# Altium footprint library uc_connectors.PcbLib: 237 footprints (part 15 of 15)
Each footprint in its own frame and in the unit in brackets; x right, y up, seen from the top. Pads: shape width x height; smd on the part's side, far side on the other; paste and mask are expansions set on the pad; w line width, h text height; cw(c..) or ccw(c..) is an arc to the next point about the centre after c.
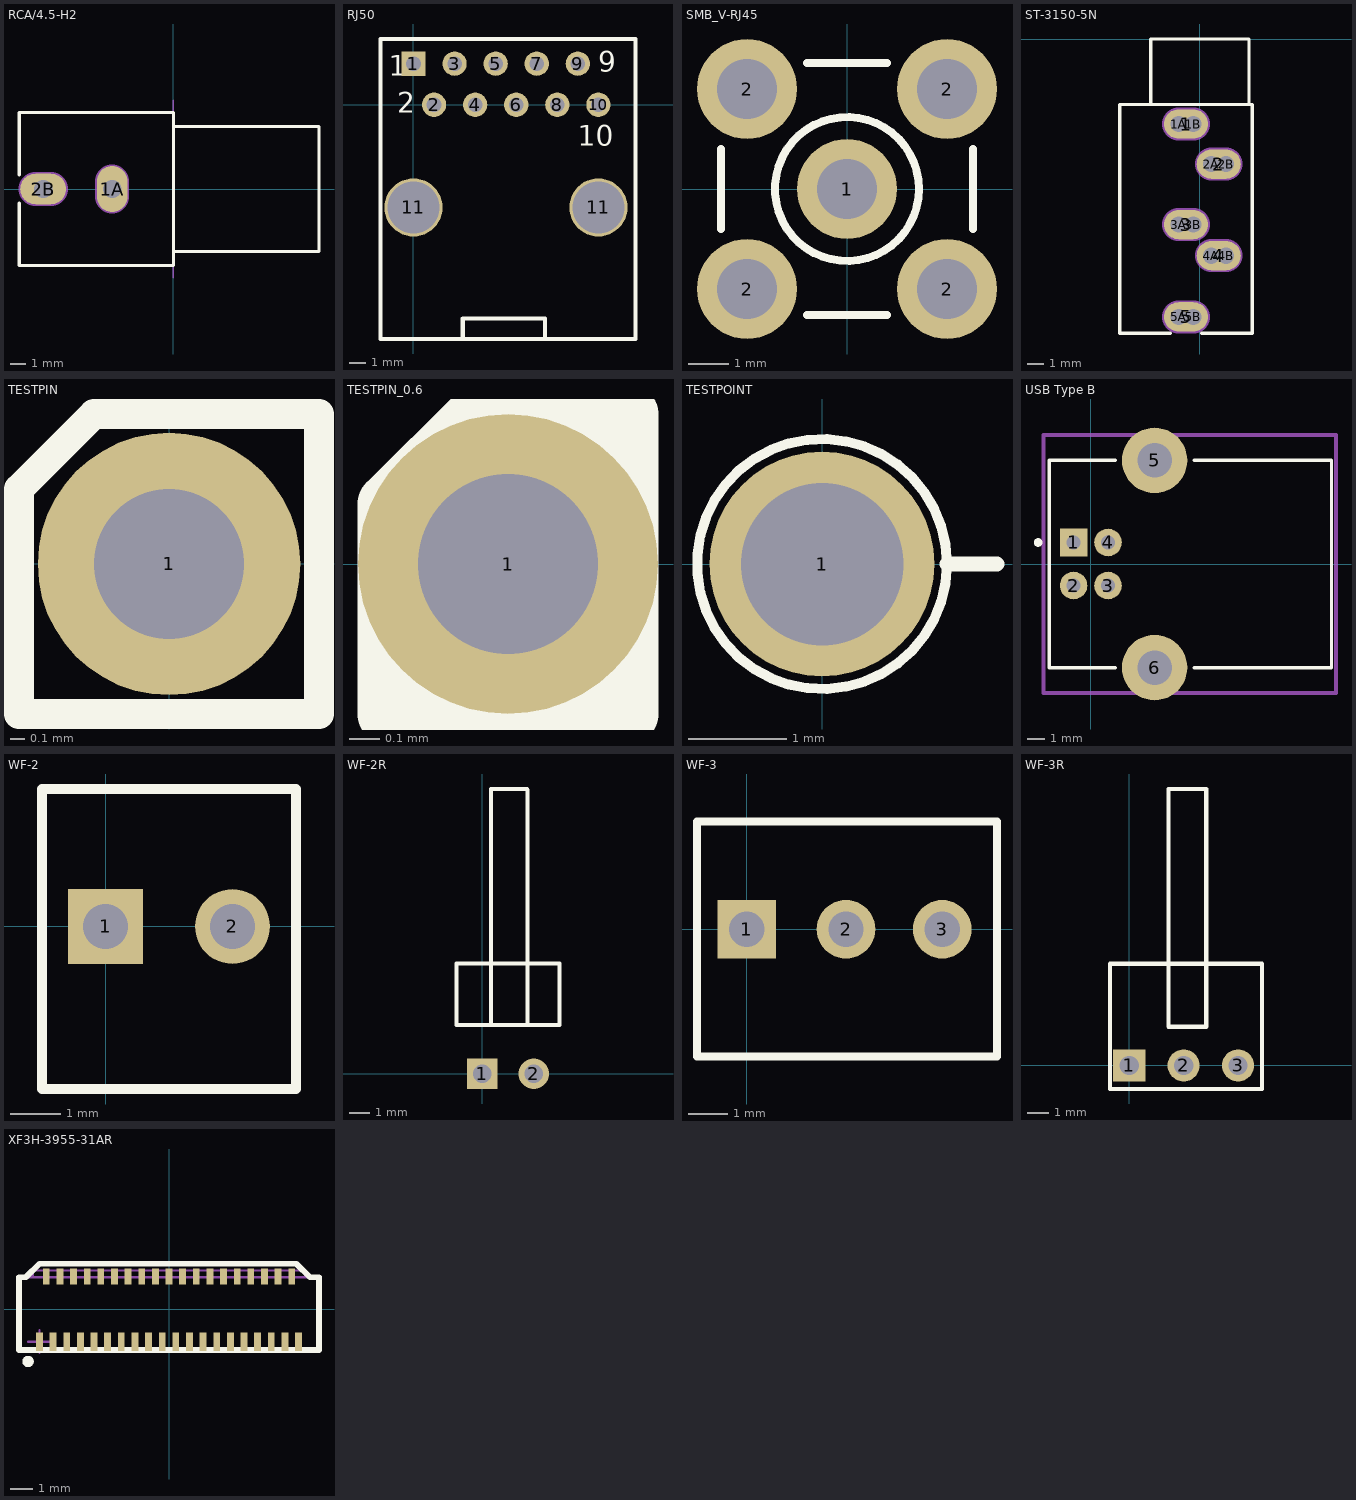
[diagram p14: the footprints below, top view; thin cyan lines are the x and y axes]

## RCA/4.5-H2 [mm] "Two Conductor Jack (RCA), Right Angle, Thru-Hole, Body 10 x 10 x 13 mm (WxTxH)"
height 13
pads (2):
  oval 2x3 hole 1.2: 1A(-4,0)
  oval 3x2 hole 1.2: 2B(-8.496,0)
Top Overlay:
  lines w0.2: -10.075,5 -0.018,5 ; -10.057,-0.92 -10.057,-5 0,-5 0,5 ; -10.057,0.92 -10.057,5 ; 0,-4.065 9.5,-4.065 9.5,4.065 0,4.065
Mechanical 1:
  lines w0.1: 0,-5.8 0,5.8
  lines w1.2: -8.996,0 -7.996,0 ; -4,-0.5 -4,0.5
  text "PCB Edge" at -0.333,-4.618 h0.25
  text "Alert PCB fab to slot details" at -10.057,7.842 h0.3
  text "Slot 1.2x2.2mm, PTH" at -10.057,7.342 h0.3
  text "Assign keep-out area to slot" at -10.057,8.342 h0.3
  text "Mech 1 - Slot cut-out" at -10.057,6.842 h0.3
  text "Mech 2 - Clearance, move to internal plane if present" at -10.057,6.342 h0.3
Mechanical 2:
  lines w2.216: -8.996,0 -7.996,0 ; -4,-0.5 -4,0.5

## RJ50 [mm] "Connector; Header; 5x2 Position"
pads (12):
  rect 1.5x1.5 hole 0.9: 1(0,2.54)
  round 1.5 hole 0.9: 2(1.27,0) 3(2.54,2.54) 4(3.81,0) 5(5.08,2.54) 6(6.35,0) 7(7.62,2.54) 8(8.89,0) 9(10.16,2.54) 10(11.43,0)
  round 3.6 hole 3.2: 11(0,-6.35) 11(11.43,-6.35)
Top Overlay:
  lines w0.254: 3.048,-14.456 3.048,-13.208 8.128,-13.208 8.128,-14.456 ; -2.032,-14.478 -2.032,4.064 13.716,4.064 13.716,-14.478 -2.032,-14.478
  text "2" at -1.016,-0.508 h1.27
  text "1" at -1.524,1.778 h1.27
  text "9" at 11.43,2.032 h1.27
  text "10" at 10.16,-2.54 h1.27
3D body "User Library-ConecConvTelefonico10viasAcodado76365101RRojo.step": height 12.5, standoff -3.6, extent -1.778,-14.334 13.488,3.666

## SMB_V-RJ45 [mm] "Connector; SMB Straight"
pads (5):
  round 2.5 hole 1.5: 1(0,0) 2(-2.5,-2.5) 2(-2.5,2.5) 2(2.5,-2.5) 2(2.5,2.5)
Top Overlay:
  circle w0.2: c0,0 r1.8
  lines w0.2: -3.15,-1 -3.15,1 ; -1,-3.15 1,-3.15 ; -1,3.15 1,3.15 ; 3.15,-1 3.15,1
Mechanical 1:
  circle w0.025: c0,0 r1.8
  circle w0.025: c0,0 r1.05
  circle w0.025: c0,0 r0.2

## ST-3150-5N [mm] "Connector; Stereo Jack, 3.5mm, 5 Position"
pads (15):
  oval 2.7x1.8 all layers, no hole: 1(-0.85,-5.2) 2(1.15,-7.65) 3(-0.85,-11.35) 4(1.15,-13.25) 5(-0.85,-17)
  round 1.2 hole 1: 1A(-1.3,-5.2) 1B(-0.4,-5.2) 2A(0.7,-7.65) 2B(1.6,-7.65) 3A(-1.3,-11.35) 3B(-0.4,-11.35) 4A(0.7,-13.25) 4B(1.6,-13.25) 5A(-1.3,-17) 5B(-0.4,-17)
Top Overlay:
  lines w0.2: -3,-4 -3,0 3,0 3,-4 ; -1.8,-18 -4.9,-18 -4.9,-4 3.2,-4 3.2,-18 0.1,-18
Mechanical 1:
  lines w1: -1.3,-17 -0.4,-17 ; -1.3,-11.35 -0.4,-11.35 ; -1.3,-5.2 -0.4,-5.2 ; 0.7,-13.25 1.6,-13.25 ; 0.7,-7.65 1.6,-7.65
  text "Mech 2 - Clearance, move to internal plane if present" at -7.226,0.374 h0.3
  text "Mech 1 - Slot cut-out" at -7.226,0.874 h0.3
  text "Assign keep-out area to slot" at -7.226,2.374 h0.3
  text "Slot 1x1.9mm, PTH" at -7.226,1.374 h0.3
  text "Alert PCB fab to slot details" at -7.226,1.874 h0.3
Mechanical 2:
  lines w2.016: -1.3,-17 -0.4,-17 ; -1.3,-11.35 -0.4,-11.35 ; -1.3,-5.2 -0.4,-5.2 ; 0.7,-13.25 1.6,-13.25 ; 0.7,-7.65 1.6,-7.65

## TESTPIN [mil]
pads (1):
  round 70 hole 40: 1(0,0)
Top Overlay:
  lines w8: -40,-40 40,-40 40,40 -20,40 -40,20 -40,-40
3D body: height 470, standoff -120, extent -15,-15 15,15
3D body: height 40, standoff 0, extent -40,-40 40,40

## TESTPIN_0.6 [mm]
pads (1):
  round 1 hole 0.6: 1(0,0)
Top Overlay:
  lines w0.203: -0.4,-0.5 -0.4,0.2 -0.1,0.5 0.4,0.5 0.4,-0.5 -0.4,-0.5

## TESTPOINT [mil]
pads (1):
  round 90 hole 65: 1(0,0)
Top Overlay:
  circle w4: c0,0 r50
  lines w6: 50,0 70,0
3D body: height 125, standoff 5, extent -52,-51.79 51.59,52
3D body: height 150, standoff -100, extent -19.84,-20 20,19.92
3D body: height 253.89, standoff 146.11, extent -53.79,-23.5 53.79,21.5

## USB Type B [mm] "Connector; USB1.1, Type B, Thru-Hole; 4 Position; Right Angle"
height 11.1
pads (6):
  rect 1.6x1.6 hole 0.8: 1(-1,1.25)
  round 1.6 hole 0.8: 2(-1,-1.25) 3(1,-1.25) 4(1,1.25)
  round 3.8 hole 2: 5(3.71,6.02) 6(3.71,-6.02)
Top Overlay:
  circle w0.25: c-3.06,1.25 r0.125
  lines w0.2: 1.41,-6.02 -2.41,-6.02 -2.41,6.02 1.41,6.02 ; 6.01,-6.02 13.99,-6.02 13.99,6.02 6.01,6.02
Mechanical 15:
  lines w0.254: -2.75,-7.5 -2.75,7.5 14.25,7.5 14.25,-7.5 -2.75,-7.5
3D body "User Library-Samtec - USB-B-S-X-W-TH.STEP": height 11, standoff -3.64, extent -2.55,-7.4 13.95,7.398

## WF-2 [mm] "Connector; Header; 2 Position"
pads (2):
  rect 1.5x1.5 hole 0.9: 1(0,0)
  round 1.5 hole 0.9: 2(2.54,0)
Top Overlay:
  lines w0.2: -1.27,-3.25 -1.27,2.75 3.81,2.75 3.81,-3.25 -1.27,-3.25
3D body "User Library-WF-2.STEP": height 11.73, standoff -2.55, extent -1.35,-3.25 3.85,2.65

## WF-2R [mm] "Connector; Header; 2 Position"
pads (2):
  rect 1.5x1.5 hole 0.9: 1(0,0)
  round 1.5 hole 0.9: 2(2.54,0)
Top Overlay:
  lines w0.2: -1.27,5.4 -1.27,2.4 3.81,2.4 3.81,5.4 ; -1.27,5.45 3.81,5.45 ; 0.43,2.5 0.43,14 ; 0.43,14.05 2.2,14.05 ; 2.23,2.4 2.23,14
3D body "User Library-WF-2R.step": height 5.8, standoff -3.4, extent -1.18,-0.3 3.9,12.9

## WF-3 [mm] "Connector; Header 2.54; 3 Position"
pads (3):
  rect 1.5x1.5 hole 0.9: 1(0,0)
  round 1.5 hole 0.9: 2(2.54,0) 3(5,0)
Top Overlay:
  lines w0.2: -1.27,-3.25 6.4,-3.25 6.4,2.75 -1.27,2.75 -1.27,-3.25
3D body "User Library-WF-3.step": height 11.73, standoff -3, extent -1.36,-3.2 6.44,2.7

## WF-3R [mm] "Connector; Header; 3 Position"
pads (3):
  rect 1.5x1.5 hole 0.9: 1(0,0)
  round 1.5 hole 0.9: 2(2.54,0) 3(5.08,0)
Top Overlay:
  lines w0.2: -0.9,-1.1 6.2,-1.1 6.2,4.75 -0.9,4.75 -0.9,-1.1 ; 1.83,1.8 3.6,1.8 3.6,12.9 1.83,12.9 1.83,1.8
3D body "User Library-WF-2R.step": height 5.8, standoff -3.4, extent 0.12,-0.3 5.2,12.9

## XF3H-3955-31AR [mm] "Connector; FPC/FFC, SM, 50 Position, Right Angle, Pitch 0.3mm"
height 2
pads (39):
  rect 0.3x0.8 smd: 1(-5.7,-1.432) 3(-5.1,-1.432) 5(-4.5,-1.432) 7(-3.9,-1.432) 9(-3.3,-1.432) 11(-2.7,-1.432) 13(-2.1,-1.432) 15(-1.5,-1.432) 17(-0.9,-1.432) 19(-0.3,-1.432) 21(0.3,-1.432) 23(0.9,-1.432) 25(1.5,-1.432) 27(2.1,-1.432) 29(2.7,-1.432) 31(3.3,-1.432) 33(3.9,-1.432) 35(4.5,-1.432) 37(5.1,-1.432) 39(5.7,-1.432)
  rect 0.3x0.7 smd: 2(-5.4,1.433) 4(-4.8,1.433) 6(-4.2,1.433) 8(-3.6,1.433) 10(-3,1.433) 12(-2.4,1.433) 14(-1.8,1.433) 16(-1.2,1.433) 18(-0.6,1.433) 20(0,1.433) 22(0.6,1.433) 24(1.2,1.433) 26(1.8,1.433) 28(2.4,1.433) 30(3,1.433) 32(3.6,1.433) 34(4.2,1.433) 36(4.8,1.433) 38(5.4,1.433)
Top Overlay:
  circle w0.25: c-6.2,-2.3 r0.125
  lines w0.254: -6.6,-1.8 6.6,-1.8 6.6,1.4 6.2,1.4 5.6,2 -5.7,2 -6.3,1.4 -6.6,1.4 -6.6,-1.8
Mechanical 13:
  lines w0.1: -6,1.4 -6,1.7 6,1.7 6,1.4 ; -6.6,-1.75 6.6,-1.75 6.6,1.4 -6.6,1.4 -6.6,-1.75
Mechanical 15:
  lines w0.1: -6.2,-1.432 -5.2,-1.432 ; -5.7,-1.932 -5.7,-0.932